# Altium footprint library IC.PCBLIB: 359 footprints (part 7 of 23)
Each footprint in its own frame and in the unit in brackets; x right, y up, seen from the top. Pads: shape width x height; smd on the part's side, far side on the other; paste and mask are expansions set on the pad; w line width, h text height; cw(c..) or ccw(c..) is an arc to the next point about the centre after c.
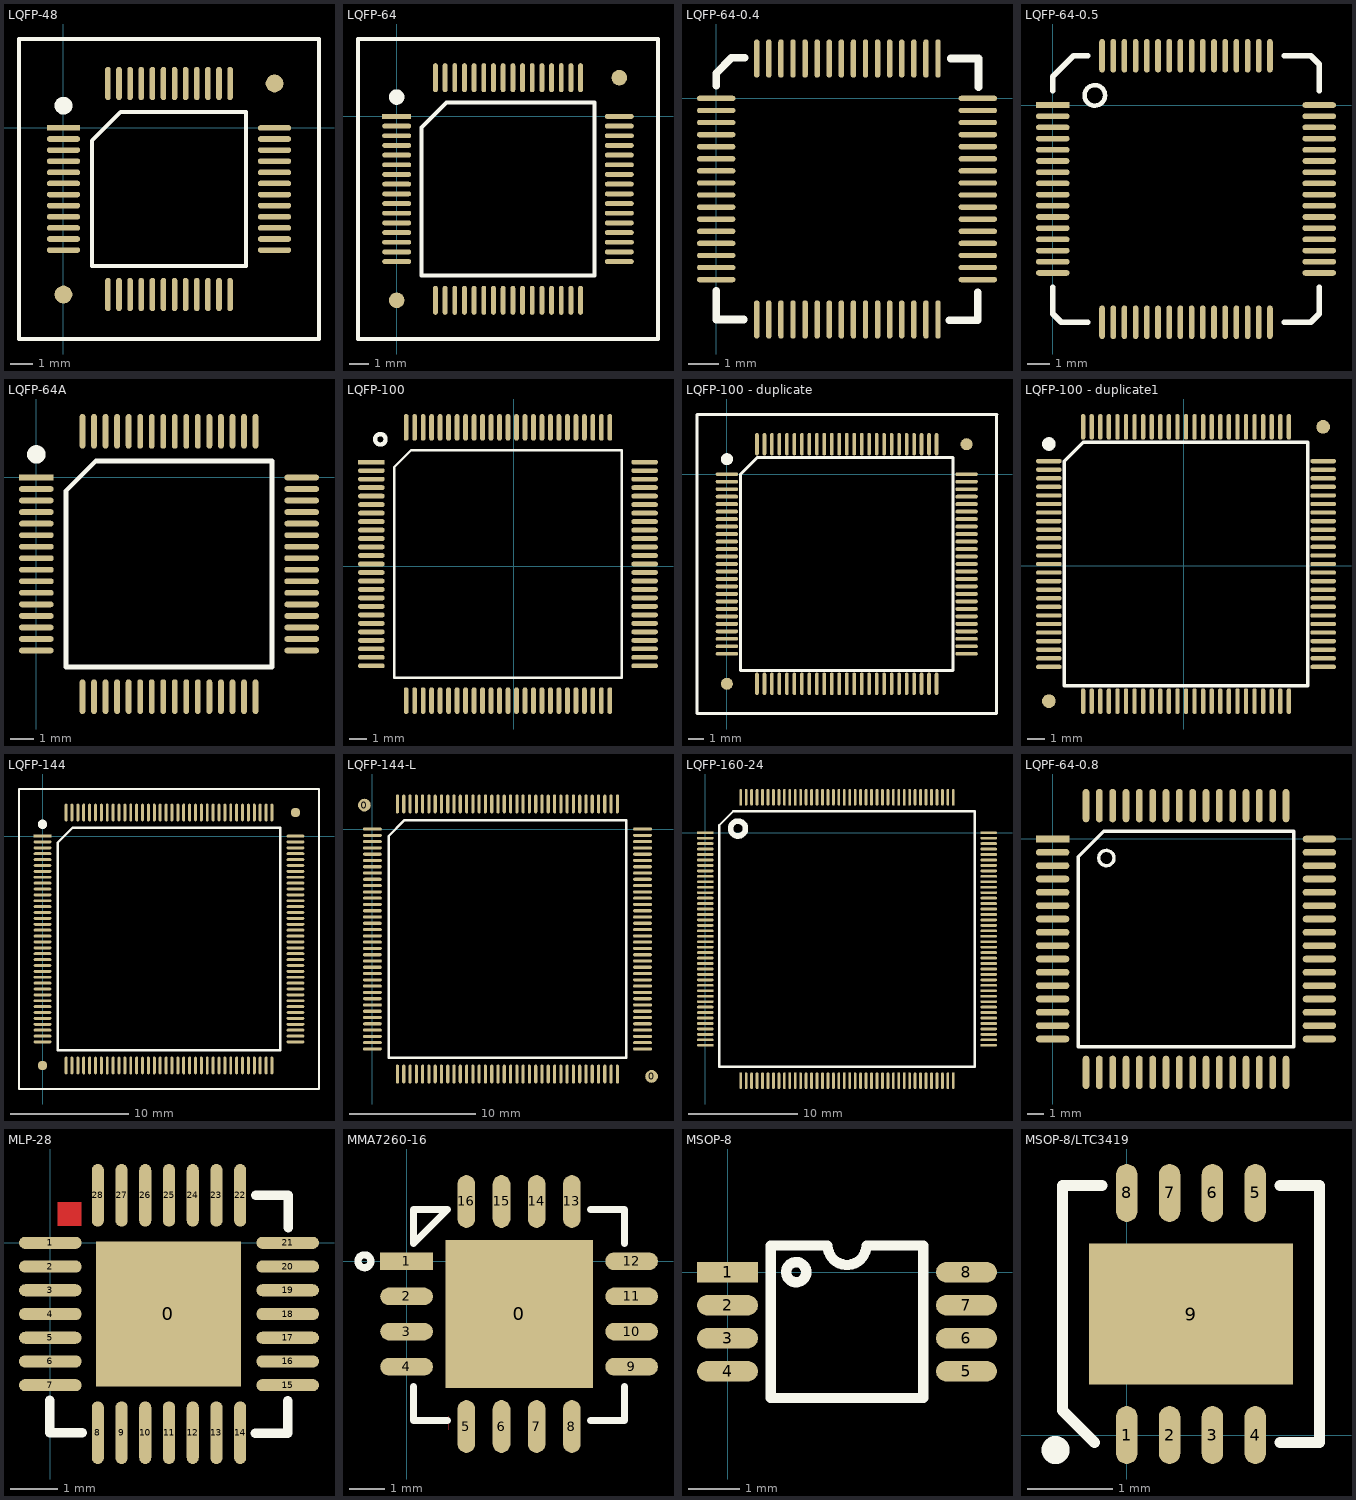
[diagram p6: the footprints below, top view; thin cyan lines are the x and y axes]

## LQFP-48 [mm]
pads (50):
  rect 1.5x0.25 smd: 1(0,0)
  oval 1.5x0.25 smd: 2(0,-0.5) 3(0,-1) 4(0,-1.5) 5(0,-2) 6(0,-2.5) 7(0,-3) 8(0,-3.5) 9(0,-4) 10(0,-4.5) 11(0,-5) 12(0,-5.5) 25(9.5,-5.5) 26(9.5,-5) 27(9.5,-4.5) 28(9.5,-4) 29(9.5,-3.5) 30(9.5,-3) 31(9.5,-2.5) 32(9.5,-2) 33(9.5,-1.5) 34(9.5,-1) 35(9.5,-0.5) 36(9.5,0)
  oval 0.25x1.5 smd: 13(2,-7.5) 14(2.5,-7.5) 15(3,-7.5) 16(3.5,-7.5) 17(4,-7.5) 18(4.5,-7.5) 19(5,-7.5) 20(5.5,-7.5) 21(6,-7.5) 22(6.5,-7.5) 23(7,-7.5) 24(7.5,-7.5) 37(7.5,2) 38(7,2) 39(6.5,2) 40(6,2) 41(5.5,2) 42(5,2) 43(4.5,2) 44(4,2) 45(3.5,2) 46(3,2) 47(2.5,2) 48(2,2)
  round 0.8 smd: ""(0,-7.5) ""(9.5,2)
TopOverlay:
  circle w0.4: c0,1 r0.2
  lines w0.2: -2,-9.5 -2,4 11.5,4 11.5,-9.5 -2,-9.5 ; 1.285,-6.215 8.215,-6.215 8.215,0.715 2.57,0.715 1.285,-0.57 1.285,-6.215

## LQFP-64 [mm]
pads (66):
  rect 1.5x0.25 smd: 1(0,0)
  oval 1.5x0.25 smd: 2(0,-0.5) 3(0,-1) 4(0,-1.5) 5(0,-2) 6(0,-2.5) 7(0,-3) 8(0,-3.5) 9(0,-4) 10(0,-4.5) 11(0,-5) 12(0,-5.5) 13(0,-6) 14(0,-6.5) 15(0,-7) 16(0,-7.5) 33(11.5,-7.5) 34(11.5,-7) 35(11.5,-6.5) 36(11.5,-6) 37(11.5,-5.5) 38(11.5,-5) 39(11.5,-4.5) 40(11.5,-4) 41(11.5,-3.5) 42(11.5,-3) 43(11.5,-2.5) 44(11.5,-2) 45(11.5,-1.5) 46(11.5,-1) 47(11.5,-0.5) 48(11.5,0)
  oval 0.25x1.5 smd: 17(2,-9.5) 18(2.5,-9.5) 19(3,-9.5) 20(3.5,-9.5) 21(4,-9.5) 22(4.5,-9.5) 23(5,-9.5) 24(5.5,-9.5) 25(6,-9.5) 26(6.5,-9.5) 27(7,-9.5) 28(7.5,-9.5) 29(8,-9.5) 30(8.5,-9.5) 31(9,-9.5) 32(9.5,-9.5) 49(9.5,2) 50(9,2) 51(8.5,2) 52(8,2) 53(7.5,2) 54(7,2) 55(6.5,2) 56(6,2) 57(5.5,2) 58(5,2) 59(4.5,2) 60(4,2) 61(3.5,2) 62(3,2) 63(2.5,2) 64(2,2)
  round 0.8 smd: ""(0,-9.5) ""(11.5,2)
TopOverlay:
  circle w0.4: c0,1 r0.2
  lines w0.2: -2,-11.5 -2,4 13.5,4 13.5,-11.5 -2,-11.5 ; 1.285,-8.215 10.215,-8.215 10.215,0.715 2.57,0.715 1.285,-0.57 1.285,-8.215

## LQFP-64-0.4 [mil]
height 40
pads (64):
  oval 50x7 smd: 1(0,0) 2(0,-15.75) 3(0,-31.5) 4(0,-47.24) 5(0,-62.99) 6(0,-78.74) 7(0,-94.49) 8(0,-110.24) 9(0,-125.98) 10(0,-141.73) 11(0,-157.48) 12(0,-173.23) 13(0,-188.98) 14(0,-204.72) 15(0,-220.47) 16(0,-236.22) 33(341,-236.22) 34(341,-220.47) 35(341,-204.72) 36(341,-188.98) 37(341,-173.23) 38(341,-157.48) 39(341,-141.73) 40(341,-125.98) 41(341,-110.24) 42(341,-94.49) 43(341,-78.74) 44(341,-62.99) 45(341,-47.24) 46(341,-31.5) 47(341,-15.75) 48(341,0)
  oval 7x50 smd: 17(52.89,-288.11) 18(68.64,-288.11) 19(84.39,-288.11) 20(100.13,-288.11) 21(115.88,-288.11) 22(131.63,-288.11) 23(147.38,-288.11) 24(163.13,-288.11) 25(178.87,-288.11) 26(194.62,-288.11) 27(210.37,-288.11) 28(226.12,-288.11) 29(241.87,-288.11) 30(257.61,-288.11) 31(273.36,-288.11) 32(289.11,-288.11) 49(289.11,51.89) 50(273.36,51.89) 51(257.61,51.89) 52(241.87,51.89) 53(226.12,51.89) 54(210.37,51.89) 55(194.62,51.89) 56(178.87,51.89) 57(163.13,51.89) 58(147.38,51.89) 59(131.63,51.89) 60(115.88,51.89) 61(100.13,51.89) 62(84.39,51.89) 63(68.64,51.89) 64(52.89,51.89)
TopOverlay:
  lines w10: 0,-251.11 0,-288.11 36.11,-288.11 ; 0,16.78 0,32.89 20,52.89 37,52.89 ; 304,-289.11 341,-289.11 341,-253 ; 305.89,51.89 342,51.89 342,14.89

## LQFP-64-0.5 [mm]
pads (64):
  rect 1.5x0.25 smd: 1(0,0)
  oval 1.5x0.25 smd: 2(0,-0.5) 3(0,-1) 4(0,-1.5) 5(0,-2) 6(0,-2.5) 7(0,-3) 8(0,-3.5) 9(0,-4) 10(0,-4.5) 11(0,-5) 12(0,-5.5) 13(0,-6) 14(0,-6.5) 15(0,-7) 16(0,-7.5) 33(11.9,-7.5) 34(11.9,-7) 35(11.9,-6.5) 36(11.9,-6) 37(11.9,-5.5) 38(11.9,-5) 39(11.9,-4.5) 40(11.9,-4) 41(11.9,-3.5) 42(11.9,-3) 43(11.9,-2.5) 44(11.9,-2) 45(11.9,-1.5) 46(11.9,-1) 47(11.9,-0.5) 48(11.9,0)
  oval 0.25x1.5 smd: 17(2.2,-9.7) 18(2.7,-9.7) 19(3.2,-9.7) 20(3.7,-9.7) 21(4.2,-9.7) 22(4.7,-9.7) 23(5.2,-9.7) 24(5.7,-9.7) 25(6.2,-9.7) 26(6.7,-9.7) 27(7.2,-9.7) 28(7.7,-9.7) 29(8.2,-9.7) 30(8.7,-9.7) 31(9.2,-9.7) 32(9.7,-9.7) 49(9.7,2.2) 50(9.2,2.2) 51(8.7,2.2) 52(8.2,2.2) 53(7.7,2.2) 54(7.2,2.2) 55(6.7,2.2) 56(6.2,2.2) 57(5.7,2.2) 58(5.2,2.2) 59(4.7,2.2) 60(4.2,2.2) 61(3.7,2.2) 62(3.2,2.2) 63(2.7,2.2) 64(2.2,2.2)
TopOverlay:
  circle w0.203: c1.878,0.432 r0.459
  lines w0.254: 0,-8.135 0,-9.319 0.381,-9.7 1.565,-9.7 ; 0,0.635 0,1.27 0.93,2.2 1.565,2.2 ; 10.335,-9.7 11.519,-9.7 11.9,-9.319 11.9,-8.135 ; 10.335,2.2 11.519,2.2 11.9,1.819 11.9,0.635

## LQFP-64A [mm]
pads (64):
  rect 1.5x0.25 smd: 1(0,0)
  oval 1.5x0.25 smd: 2(0,-0.5) 3(0,-1) 4(0,-1.5) 5(0,-2) 6(0,-2.5) 7(0,-3) 8(0,-3.5) 9(0,-4) 10(0,-4.5) 11(0,-5) 12(0,-5.5) 13(0,-6) 14(0,-6.5) 15(0,-7) 16(0,-7.5) 33(11.5,-7.5) 34(11.5,-7) 35(11.5,-6.5) 36(11.5,-6) 37(11.5,-5.5) 38(11.5,-5) 39(11.5,-4.5) 40(11.5,-4) 41(11.5,-3.5) 42(11.5,-3) 43(11.5,-2.5) 44(11.5,-2) 45(11.5,-1.5) 46(11.5,-1) 47(11.5,-0.5) 48(11.5,0)
  oval 0.25x1.5 smd: 17(2,-9.5) 18(2.5,-9.5) 19(3,-9.5) 20(3.5,-9.5) 21(4,-9.5) 22(4.5,-9.5) 23(5,-9.5) 24(5.5,-9.5) 25(6,-9.5) 26(6.5,-9.5) 27(7,-9.5) 28(7.5,-9.5) 29(8,-9.5) 30(8.5,-9.5) 31(9,-9.5) 32(9.5,-9.5) 49(9.5,2) 50(9,2) 51(8.5,2) 52(8,2) 53(7.5,2) 54(7,2) 55(6.5,2) 56(6,2) 57(5.5,2) 58(5,2) 59(4.5,2) 60(4,2) 61(3.5,2) 62(3,2) 63(2.5,2) 64(2,2)
TopOverlay:
  circle w0.4: c0,1 r0.2
  lines w0.2: 1.285,-8.215 1.285,-0.57 2.57,0.715 10.215,0.715 10.215,-8.215 1.285,-8.215

## LQFP-100 [mil]
pads (100):
  rect 62x11.02 smd: 1(-330,241)
  oval 62x11.02 smd: 2(-330,221.31) 3(-330,201.63) 4(-330,181.94) 5(-330,162.26) 6(-330,142.57) 7(-330,122.89) 8(-330,103.2) 9(-330,83.52) 10(-330,63.84) 11(-330,44.15) 12(-330,24.46) 13(-330,4.78) 14(-330,-14.9) 15(-330,-34.59) 16(-330,-54.27) 17(-330,-73.96) 18(-330,-93.64) 19(-330,-113.33) 20(-330,-133.01) 21(-330,-152.7) 22(-330,-172.38) 23(-330,-192.07) 24(-330,-211.75) 25(-330,-231.44) 51(303.87,-231.44) 52(303.87,-211.75) 53(303.87,-192.07) 54(303.87,-172.38) 55(303.87,-152.7) 56(303.87,-133.01) 57(303.87,-113.33) 58(303.87,-93.64) 59(303.87,-73.96) 60(303.87,-54.27) 61(303.87,-34.59) 62(303.87,-14.9) 63(303.87,4.78) 64(303.87,24.46) 65(303.87,44.15) 66(303.87,63.84) 67(303.87,83.52) 68(303.87,103.2) 69(303.87,122.89) 70(303.87,142.57) 71(303.87,162.26) 72(303.87,181.94) 73(303.87,201.63) 74(303.87,221.31) 75(303.87,241)
  oval 11.02x62 smd: 26(-249.28,-312.16) 27(-229.6,-312.16) 28(-209.91,-312.16) 29(-190.23,-312.16) 30(-170.54,-312.16) 31(-150.86,-312.16) 32(-131.17,-312.16) 33(-111.49,-312.16) 34(-91.8,-312.16) 35(-72.12,-312.16) 36(-52.43,-312.16) 37(-32.75,-312.16) 38(-13.06,-312.16) 39(6.62,-312.16) 40(26.31,-312.16) 41(45.99,-312.16) 42(65.68,-312.16) 43(85.36,-312.16) 44(105.05,-312.16) 45(124.73,-312.16) 46(144.42,-312.16) 47(164.1,-312.16) 48(183.79,-312.16) 49(203.47,-312.16) 50(223.16,-312.16) 76(223.16,321.72) 77(203.47,321.72) 78(183.79,321.72) 79(164.1,321.72) 80(144.42,321.72) 81(124.73,321.72) 82(105.05,321.72) 83(85.36,321.72) 84(65.68,321.72) 85(45.99,321.72) 86(26.31,321.72) 87(6.62,321.72) 88(-13.06,321.72) 89(-32.75,321.72) 90(-52.43,321.72) 91(-72.12,321.72) 92(-91.8,321.72) 93(-111.49,321.72) 94(-131.17,321.72) 95(-150.86,321.72) 96(-170.54,321.72) 97(-190.23,321.72) 98(-209.91,321.72) 99(-229.6,321.72) 100(-249.28,321.72)
TopOverlay:
  circle w10: c-309.17,294 r12.16
  lines w5.91: -277.24,-259.39 -277.24,229.19 -237.47,268.95 251.11,268.95 251.11,-259.39 -277.24,-259.39

## LQFP-100 - duplicate [mm]
pads (102):
  oval 1.5x0.25 smd: 1(0,0) 2(0,-0.5) 3(0,-1) 4(0,-1.5) 5(0,-2) 6(0,-2.5) 7(0,-3) 8(0,-3.5) 9(0,-4) 10(0,-4.5) 11(0,-5) 12(0,-5.5) 13(0,-6) 14(0,-6.5) 15(0,-7) 16(0,-7.5) 17(0,-8) 18(0,-8.5) 19(0,-9) 20(0,-9.5) 21(0,-10) 22(0,-10.5) 23(0,-11) 24(0,-11.5) 25(0,-12) 51(16,-12) 52(16,-11.5) 53(16,-11) 54(16,-10.5) 55(16,-10) 56(16,-9.5) 57(16,-9) 58(16,-8.5) 59(16,-8) 60(16,-7.5) 61(16,-7) 62(16,-6.5) 63(16,-6) 64(16,-5.5) 65(16,-5) 66(16,-4.5) 67(16,-4) 68(16,-3.5) 69(16,-3) 70(16,-2.5) 71(16,-2) 72(16,-1.5) 73(16,-1) 74(16,-0.5) 75(16,0)
  oval 0.25x1.5 smd: 26(2,-14) 27(2.5,-14) 28(3,-14) 29(3.5,-14) 30(4,-14) 31(4.5,-14) 32(5,-14) 33(5.5,-14) 34(6,-14) 35(6.5,-14) 36(7,-14) 37(7.5,-14) 38(8,-14) 39(8.5,-14) 40(9,-14) 41(9.5,-14) 42(10,-14) 43(10.5,-14) 44(11,-14) 45(11.5,-14) 46(12,-14) 47(12.5,-14) 48(13,-14) 49(13.5,-14) 50(14,-14) 76(14,2) 77(13.5,2) 78(13,2) 79(12.5,2) 80(12,2) 81(11.5,2) 82(11,2) 83(10.5,2) 84(10,2) 85(9.5,2) 86(9,2) 87(8.5,2) 88(8,2) 89(7.5,2) 90(7,2) 91(6.5,2) 92(6,2) 93(5.5,2) 94(5,2) 95(4.5,2) 96(4,2) 97(3.5,2) 98(3,2) 99(2.5,2) 100(2,2)
  round 0.8 smd: ""(0,-14) ""(16,2)
TopOverlay:
  circle w0.4: c0,1 r0.2
  lines w0.2: 18,4 18,-16 -2,-16 -2,4 18.034,4 ; 0.9,-13.1 0.9,0 2,1.1 15.1,1.1 15.1,-13.1 0.9,-13.1

## LQFP-100 - duplicate1 [mm]
pads (102):
  oval 1.5x0.25 smd: 1(-7.874,6.096) 2(-7.874,5.596) 3(-7.874,5.096) 4(-7.874,4.596) 5(-7.874,4.096) 6(-7.874,3.596) 7(-7.874,3.096) 8(-7.874,2.596) 9(-7.874,2.096) 10(-7.874,1.596) 11(-7.874,1.096) 12(-7.874,0.596) 13(-7.874,0.096) 14(-7.874,-0.404) 15(-7.874,-0.904) 16(-7.874,-1.404) 17(-7.874,-1.904) 18(-7.874,-2.404) 19(-7.874,-2.904) 20(-7.874,-3.404) 21(-7.874,-3.904) 22(-7.874,-4.404) 23(-7.874,-4.904) 24(-7.874,-5.404) 25(-7.874,-5.904) 51(8.126,-5.904) 52(8.126,-5.404) 53(8.126,-4.904) 54(8.126,-4.404) 55(8.126,-3.904) 56(8.126,-3.404) 57(8.126,-2.904) 58(8.126,-2.404) 59(8.126,-1.904) 60(8.126,-1.404) 61(8.126,-0.904) 62(8.126,-0.404) 63(8.126,0.096) 64(8.126,0.596) 65(8.126,1.096) 66(8.126,1.596) 67(8.126,2.096) 68(8.126,2.596) 69(8.126,3.096) 70(8.126,3.596) 71(8.126,4.096) 72(8.126,4.596) 73(8.126,5.096) 74(8.126,5.596) 75(8.126,6.096)
  oval 0.25x1.5 smd: 26(-5.874,-7.904) 27(-5.374,-7.904) 28(-4.874,-7.904) 29(-4.374,-7.904) 30(-3.874,-7.904) 31(-3.374,-7.904) 32(-2.874,-7.904) 33(-2.374,-7.904) 34(-1.874,-7.904) 35(-1.374,-7.904) 36(-0.874,-7.904) 37(-0.374,-7.904) 38(0.126,-7.904) 39(0.626,-7.904) 40(1.126,-7.904) 41(1.626,-7.904) 42(2.126,-7.904) 43(2.626,-7.904) 44(3.126,-7.904) 45(3.626,-7.904) 46(4.126,-7.904) 47(4.626,-7.904) 48(5.126,-7.904) 49(5.626,-7.904) 50(6.126,-7.904) 76(6.126,8.096) 77(5.626,8.096) 78(5.126,8.096) 79(4.626,8.096) 80(4.126,8.096) 81(3.626,8.096) 82(3.126,8.096) 83(2.626,8.096) 84(2.126,8.096) 85(1.626,8.096) 86(1.126,8.096) 87(0.626,8.096) 88(0.126,8.096) 89(-0.374,8.096) 90(-0.874,8.096) 91(-1.374,8.096) 92(-1.874,8.096) 93(-2.374,8.096) 94(-2.874,8.096) 95(-3.374,8.096) 96(-3.874,8.096) 97(-4.374,8.096) 98(-4.874,8.096) 99(-5.374,8.096) 100(-5.874,8.096)
  round 0.8 smd: ""(-7.874,-7.904) ""(8.126,8.096)
TopOverlay:
  circle w0.4: c-7.874,7.096 r0.2
  lines w0.2: -6.974,-7.004 7.226,-7.004 7.226,7.196 -5.874,7.196 -6.974,6.096 -6.974,-7.004

## LQFP-144 [mm]
pads (146):
  rect 1.5x0.25 smd: 1(0,0)
  oval 1.5x0.25 smd: 2(0,-0.5) 3(0,-1) 4(0,-1.5) 5(0,-2) 6(0,-2.5) 7(0,-3) 8(0,-3.5) 9(0,-4) 10(0,-4.5) 11(0,-5) 12(0,-5.5) 13(0,-6) 14(0,-6.5) 15(0,-7) 16(0,-7.5) 17(0,-8) 18(0,-8.5) 19(0,-9) 20(0,-9.5) 21(0,-10) 22(0,-10.5) 23(0,-11) 24(0,-11.5) 25(0,-12) 26(0,-12.5) 27(0,-13) 28(0,-13.5) 29(0,-14) 30(0,-14.5) 31(0,-15) 32(0,-15.5) 33(0,-16) 34(0,-16.5) 35(0,-17) 36(0,-17.5) 73(21.5,-17.5) 74(21.5,-17) 75(21.5,-16.5) 76(21.5,-16) 77(21.5,-15.5) 78(21.5,-15) 79(21.5,-14.5) 80(21.5,-14) 81(21.5,-13.5) 82(21.5,-13) 83(21.5,-12.5) 84(21.5,-12) 85(21.5,-11.5) 86(21.5,-11) 87(21.5,-10.5) 88(21.5,-10) 89(21.5,-9.5) 90(21.5,-9) 91(21.5,-8.5) 92(21.5,-8) 93(21.5,-7.5) 94(21.5,-7) 95(21.5,-6.5) 96(21.5,-6) 97(21.5,-5.5) 98(21.5,-5) 99(21.5,-4.5) 100(21.5,-4) 101(21.5,-3.5) 102(21.5,-3) 103(21.5,-2.5) 104(21.5,-2) 105(21.5,-1.5) 106(21.5,-1) 107(21.5,-0.5) 108(21.5,0)
  oval 0.25x1.5 smd: 37(2,-19.5) 38(2.5,-19.5) 39(3,-19.5) 40(3.5,-19.5) 41(4,-19.5) 42(4.5,-19.5) 43(5,-19.5) 44(5.5,-19.5) 45(6,-19.5) 46(6.5,-19.5) 47(7,-19.5) 48(7.5,-19.5) 49(8,-19.5) 50(8.5,-19.5) 51(9,-19.5) 52(9.5,-19.5) 53(10,-19.5) 54(10.5,-19.5) 55(11,-19.5) 56(11.5,-19.5) 57(12,-19.5) 58(12.5,-19.5) 59(13,-19.5) 60(13.5,-19.5) 61(14,-19.5) 62(14.5,-19.5) 63(15,-19.5) 64(15.5,-19.5) 65(16,-19.5) 66(16.5,-19.5) 67(17,-19.5) 68(17.5,-19.5) 69(18,-19.5) 70(18.5,-19.5) 71(19,-19.5) 72(19.5,-19.5) 109(19.5,2) 110(19,2) 111(18.5,2) 112(18,2) 113(17.5,2) 114(17,2) 115(16.5,2) 116(16,2) 117(15.5,2) 118(15,2) 119(14.5,2) 120(14,2) 121(13.5,2) 122(13,2) 123(12.5,2) 124(12,2) 125(11.5,2) 126(11,2) 127(10.5,2) 128(10,2) 129(9.5,2) 130(9,2) 131(8.5,2) 132(8,2) 133(7.5,2) 134(7,2) 135(6.5,2) 136(6,2) 137(5.5,2) 138(5,2) 139(4.5,2) 140(4,2) 141(3.5,2) 142(3,2) 143(2.5,2) 144(2,2)
  round 0.8 smd: ""(0,-19.5) ""(21.5,2)
TopOverlay:
  circle w0.4: c0,1 r0.2
  lines w0.2: -2,-21.5 23.5,-21.5 23.5,4 -2,4 -2,-21.5 ; 1.285,-18.215 20.215,-18.215 20.215,0.715 2.57,0.715 1.285,-0.57 1.285,-18.215

## LQFP-144-L [mm]
height 1.016
pads (146):
  round 1.016 smd: 0(-0.635,1.905) 0(22.225,-19.685)
  oval 1.5x0.25 smd: 1(0,0) 2(0,-0.5) 3(0,-1) 4(0,-1.5) 5(0,-2) 6(0,-2.5) 7(0,-3) 8(0,-3.5) 9(0,-4) 10(0,-4.5) 11(0,-5) 12(0,-5.5) 13(0,-6) 14(0,-6.5) 15(0,-7) 16(0,-7.5) 17(0,-8) 18(0,-8.5) 19(0,-9) 20(0,-9.5) 21(0,-10) 22(0,-10.5) 23(0,-11) 24(0,-11.5) 25(0,-12) 26(0,-12.5) 27(0,-13) 28(0,-13.5) 29(0,-14) 30(0,-14.5) 31(0,-15) 32(0,-15.5) 33(0,-16) 34(0,-16.5) 35(0,-17) 36(0,-17.5) 73(21.5,-17.5) 74(21.5,-17) 75(21.5,-16.5) 76(21.5,-16) 77(21.5,-15.5) 78(21.5,-15) 79(21.5,-14.5) 80(21.5,-14) 81(21.5,-13.5) 82(21.5,-13) 83(21.5,-12.5) 84(21.5,-12) 85(21.5,-11.5) 86(21.5,-11) 87(21.5,-10.5) 88(21.5,-10) 89(21.5,-9.5) 90(21.5,-9) 91(21.5,-8.5) 92(21.5,-8) 93(21.5,-7.5) 94(21.5,-7) 95(21.5,-6.5) 96(21.5,-6) 97(21.5,-5.5) 98(21.5,-5) 99(21.5,-4.5) 100(21.5,-4) 101(21.5,-3.5) 102(21.5,-3) 103(21.5,-2.5) 104(21.5,-2) 105(21.5,-1.5) 106(21.5,-1) 107(21.5,-0.5) 108(21.5,0)
  oval 0.25x1.5 smd: 37(2,-19.5) 38(2.5,-19.5) 39(3,-19.5) 40(3.5,-19.5) 41(4,-19.5) 42(4.5,-19.5) 43(5,-19.5) 44(5.5,-19.5) 45(6,-19.5) 46(6.5,-19.5) 47(7,-19.5) 48(7.5,-19.5) 49(8,-19.5) 50(8.5,-19.5) 51(9,-19.5) 52(9.5,-19.5) 53(10,-19.5) 54(10.5,-19.5) 55(11,-19.5) 56(11.5,-19.5) 57(12,-19.5) 58(12.5,-19.5) 59(13,-19.5) 60(13.5,-19.5) 61(14,-19.5) 62(14.5,-19.5) 63(15,-19.5) 64(15.5,-19.5) 65(16,-19.5) 66(16.5,-19.5) 67(17,-19.5) 68(17.5,-19.5) 69(18,-19.5) 70(18.5,-19.5) 71(19,-19.5) 72(19.5,-19.5) 109(19.5,2) 110(19,2) 111(18.5,2) 112(18,2) 113(17.5,2) 114(17,2) 115(16.5,2) 116(16,2) 117(15.5,2) 118(15,2) 119(14.5,2) 120(14,2) 121(13.5,2) 122(13,2) 123(12.5,2) 124(12,2) 125(11.5,2) 126(11,2) 127(10.5,2) 128(10,2) 129(9.5,2) 130(9,2) 131(8.5,2) 132(8,2) 133(7.5,2) 134(7,2) 135(6.5,2) 136(6,2) 137(5.5,2) 138(5,2) 139(4.5,2) 140(4,2) 141(3.5,2) 142(3,2) 143(2.5,2) 144(2,2)
TopOverlay:
  lines w0.2: 1.285,-18.215 1.285,-0.57 2.57,0.715 20.215,0.715 20.215,-18.215 1.285,-18.215

## LQFP-160-24 [mil]
pads (160):
  rect 60x10 smd: 1(0,0)
  oval 60x10 smd: 2(0,-19.68) 3(0,-39.37) 4(0,-59.05) 5(0,-78.74) 6(0,-98.42) 7(0,-118.11) 8(0,-137.79) 9(0,-157.48) 10(0,-177.16) 11(0,-196.85) 12(0,-216.53) 13(0,-236.22) 14(0,-255.91) 15(0,-275.59) 16(0,-295.27) 17(0,-314.96) 18(0,-334.64) 19(0,-354.33) 20(0,-374.01) 21(0,-393.7) 22(0,-413.38) 23(0,-433.07) 24(0,-452.75) 25(0,-472.44) 26(0,-492.12) 27(0,-511.81) 28(0,-531.5) 29(0,-551.18) 30(0,-570.87) 31(0,-590.55) 32(0,-610.24) 33(0,-629.92) 34(0,-649.61) 35(0,-669.29) 36(0,-688.98) 37(0,-708.66) 38(0,-728.35) 39(0,-748.03) 40(0,-767.72) 81(1023.62,-767.72) 82(1023.62,-748.03) 83(1023.62,-728.35) 84(1023.62,-708.66) 85(1023.62,-688.98) 86(1023.62,-669.29) 87(1023.62,-649.61) 88(1023.62,-629.92) 89(1023.62,-610.24) 90(1023.62,-590.55) 91(1023.62,-570.87) 92(1023.62,-551.18) 93(1023.62,-531.5) 94(1023.62,-511.81) 95(1023.62,-492.12) 96(1023.62,-472.44) 97(1023.62,-452.75) 98(1023.62,-433.07) 99(1023.62,-413.38) 100(1023.62,-393.7) 101(1023.62,-374.01) 102(1023.62,-354.33) 103(1023.62,-334.64) 104(1023.62,-314.96) 105(1023.62,-295.27) 106(1023.62,-275.59) 107(1023.62,-255.91) 108(1023.62,-236.22) 109(1023.62,-216.53) 110(1023.62,-196.85) 111(1023.62,-177.16) 112(1023.62,-157.48) 113(1023.62,-137.79) 114(1023.62,-118.11) 115(1023.62,-98.42) 116(1023.62,-78.74) 117(1023.62,-59.05) 118(1023.62,-39.37) 119(1023.62,-19.68) 120(1023.62,0)
  oval 10x60 smd: 41(127.95,-895.67) 42(147.64,-895.67) 43(167.32,-895.67) 44(187.01,-895.67) 45(206.69,-895.67) 46(226.38,-895.67) 47(246.06,-895.67) 48(265.75,-895.67) 49(285.43,-895.67) 50(305.12,-895.67) 51(324.8,-895.67) 52(344.49,-895.67) 53(364.17,-895.67) 54(383.86,-895.67) 55(403.54,-895.67) 56(423.23,-895.67) 57(442.91,-895.67) 58(462.6,-895.67) 59(482.28,-895.67) 60(501.97,-895.67) 61(521.65,-895.67) 62(541.34,-895.67) 63(561.02,-895.67) 64(580.71,-895.67) 65(600.39,-895.67) 66(620.08,-895.67) 67(639.76,-895.67) 68(659.45,-895.67) 69(679.13,-895.67) 70(698.82,-895.67) 71(718.5,-895.67) 72(738.19,-895.67) 73(757.87,-895.67) 74(777.56,-895.67) 75(797.24,-895.67) 76(816.93,-895.67) 77(836.61,-895.67) 78(856.3,-895.67) 79(875.98,-895.67) 80(895.67,-895.67) 121(895.67,127.95) 122(875.98,127.95) 123(856.3,127.95) 124(836.61,127.95) 125(816.93,127.95) 126(797.24,127.95) 127(777.56,127.95) 128(757.87,127.95) 129(738.19,127.95) 130(718.5,127.95) 131(698.82,127.95) 132(679.13,127.95) 133(659.45,127.95) 134(639.76,127.95) 135(620.08,127.95) 136(600.39,127.95) 137(580.71,127.95) 138(561.02,127.95) 139(541.34,127.95) 140(521.65,127.95) 141(501.97,127.95) 142(482.28,127.95) 143(462.6,127.95) 144(442.91,127.95) 145(423.23,127.95) 146(403.54,127.95) 147(383.86,127.95) 148(364.17,127.95) 149(344.49,127.95) 150(324.8,127.95) 151(305.12,127.95) 152(285.43,127.95) 153(265.75,127.95) 154(246.06,127.95) 155(226.38,127.95) 156(206.69,127.95) 157(187.01,127.95) 158(167.32,127.95) 159(147.64,127.95) 160(127.95,127.95)
TopOverlay:
  circle w20: c118.03,15 r26.97
  lines w7.87: 50.59,-845.08 973.03,-845.08 973.03,77.36 101.18,77.36 50.59,26.77 50.59,-845.08

## LQPF-64-0.8 [mm]
pads (64):
  rect 2x0.4 smd: 1(0,0)
  oval 2x0.4 smd: 2(0,-0.8) 3(0,-1.6) 4(0,-2.4) 5(0,-3.2) 6(0,-4) 7(0,-4.8) 8(0,-5.6) 9(0,-6.4) 10(0,-7.2) 11(0,-8) 12(0,-8.8) 13(0,-9.6) 14(0,-10.4) 15(0,-11.2) 16(0,-12) 33(16,-12) 34(16,-11.2) 35(16,-10.4) 36(16,-9.6) 37(16,-8.8) 38(16,-8) 39(16,-7.2) 40(16,-6.4) 41(16,-5.6) 42(16,-4.8) 43(16,-4) 44(16,-3.2) 45(16,-2.4) 46(16,-1.6) 47(16,-0.8) 48(16,0)
  oval 0.4x2 smd: 17(2,-14) 18(2.8,-14) 19(3.6,-14) 20(4.4,-14) 21(5.2,-14) 22(6,-14) 23(6.8,-14) 24(7.6,-14) 25(8.4,-14) 26(9.2,-14) 27(10,-14) 28(10.8,-14) 29(11.6,-14) 30(12.4,-14) 31(13.2,-14) 32(14,-14) 49(14,2) 50(13.2,2) 51(12.4,2) 52(11.6,2) 53(10.8,2) 54(10,2) 55(9.2,2) 56(8.4,2) 57(7.6,2) 58(6.8,2) 59(6,2) 60(5.2,2) 61(4.4,2) 62(3.6,2) 63(2.8,2) 64(2,2)
TopOverlay:
  circle w0.203: c3.224,-1.143 r0.459
  lines w0.2: 1.535,-12.465 1.535,-1.07 3.07,0.465 14.465,0.465 14.465,-12.465 1.535,-12.465

## MLP-28 [mil]
pads (29):
  rect 120x120 smd: 0(98,-59)
  oval 52x10 smd: 1(0,0) 2(0,-19.68) 3(0,-39.37) 4(0,-59.05) 5(0,-78.74) 6(0,-98.42) 7(0,-118.11) 15(196.85,-118.11) 16(196.85,-98.42) 17(196.85,-78.74) 18(196.85,-59.05) 19(196.85,-39.37) 20(196.85,-19.68) 21(196.85,0)
  oval 10x52 smd: 8(39.37,-157.48) 9(59.06,-157.48) 10(78.74,-157.48) 11(98.43,-157.48) 12(118.11,-157.48) 13(137.8,-157.48) 14(157.48,-157.48) 22(157.48,39.37) 23(137.79,39.37) 24(118.11,39.37) 25(98.43,39.37) 26(78.74,39.37) 27(59.06,39.37) 28(39.37,39.37)
TopLayer:
  rectangle: 6,14 26,34
TopOverlay:
  lines w7.87: -0.63,-130.48 -0.63,-157.48 26.37,-157.48 ; 169.85,-158.11 196.85,-158.11 196.85,-131.11 ; 170.48,39.37 197.48,39.37 197.48,12.37
TopSolder:
  rectangle: 4,12 28,36

## MMA7260-16 [mm]
pads (17):
  rect 4.2x4.2 smd: 0(3.2,-1.499)
  rect 1.5x0.5 smd: 1(0,0)
  oval 1.5x0.5 smd: 2(0,-1) 3(0,-2) 4(0,-3) 9(6.4,-3) 10(6.4,-2) 11(6.4,-1) 12(6.4,0)
  oval 0.5x1.5 smd: 5(1.7,-4.7) 6(2.7,-4.7) 7(3.7,-4.7) 8(4.7,-4.7) 13(4.7,1.7) 14(3.7,1.7) 15(2.7,1.7) 16(1.7,1.7)
TopLayer:
  rectangle: 1.197,-4.799 1.197,-4.399
TopOverlay:
  circle w0.203: c-1.199,0 r0.183
  lines w0.203: 0.198,-3.562 0.198,-4.527 1.163,-4.527 ; 5.232,-4.527 6.198,-4.527 6.198,-3.562 ; 5.232,1.473 6.198,1.473 6.198,0.508 ; 0.198,0.508 0.198,1.473 1.163,1.473 0.198,0.508

## MSOP-8 [mm]
pads (8):
  rect 1.2x0.4 smd: 1(0,0)
  oval 1.2x0.4 smd: 2(0,-0.65) 3(0,-1.3) 4(0,-1.95) 5(4.7,-1.95) 6(4.7,-1.3) 7(4.7,-0.65) 8(4.7,0)
TopOverlay:
  circle w0.203: c1.351,0 r0.198
  lines w0.2: 0.851,0.524 1.969,0.524 ccw(c2.35,0.524) 2.731,0.524 3.849,0.524
  lines w0.203: 0.851,0.524 0.851,-2.474 3.849,-2.474 3.849,0.524

## MSOP-8/LTC3419 [mm]
pads (9):
  oval 0.25x0.675 smd: 1(0,0) 2(0.5,0) 3(1,0) 4(1.5,0) 5(1.5,2.825) 6(1,2.825) 7(0.5,2.825) 8(0,2.825)
  rect 2.38x1.65 smd: 9(0.75,1.412)
TopOverlay:
  circle w0.254: c-0.832,-0.175 r0.036
  lines w0.127: -0.375,-0.088 -0.75,0.288 -0.75,2.912 -0.288,2.912 ; 1.788,-0.088 2.25,-0.088 2.25,2.912 1.788,2.912